# Altium integrated library BYTECH_HW_LIB_2019.IntLib: 907 symbols (part 3 of 6) (continued)
## YJ-18010-nRF52840 (continued)
text: LGA Pads

## 25NA470MEFC10X20
designator C?, comment 470uF/25V
CAP ALUM 470uF 20% 25V RADIAL; MPN: 25NA470MEFC10X20; Solder: WAVE; CompanyID: VT-00047; Value: 470uF/25V; Category: CAPACITOR; PinCount: 2
footprint CAP_ALUM_D100_S50_H200
pins: 1, 2
1 alternate drawing of the same symbol

## 106CKR050M
designator C?, comment 106/50V
CAP ALUM 10uF 50V 20% RADIAL; MPN: 106CKR050M; Solder: WAVE; CompanyID: VT-00054; Value: 106/50V; Category: CAPACITOR; PinCount: 2
footprint CAP_ALUM_D050_S20_H110
pins: 1, 2
1 alternate drawing of the same symbol

## 293D106X9025C2TE3
designator C?, comment 106/25V
CAP TANT 10uF 25V 10% 2312; MPN: 293D106X9025C2TE3;T491C106K025AT7280; CompanyID: VT-00020; Solder: SMT; Value: 106/25V; Category: CAPACITOR; PinCount: 2
footprint CAP_TANTAL_2312(6032) (Chip Resistor, Body 6.0x3.2mm, IPC High Density)
pins: 1, 2

## 0603N330J500CT
designator C?, comment 33p/50V
CAP CER 33pF 50V 5%  0603; MPN: CL10C330JB8NNNC, 0603N330J500CT; CompanyID: VT-01106; Solder: SMT; Value: 33p/50V; Category: CAPACITOR; PinCount: 2
footprint CAPC-0603 (1608) (Resistor, Chip; 1.60 mm L X 0.80 mm W X 0.50 mm H body)
pins: 1, 2

## 0603N331J500CT
designator C?, comment 330p/50V
CAP CER 330PF 50V C0G/NP0 0603; MPN: 0603N331J500CT; MFR: Walsin Technology Corporation; Solder: SMT; Value: 330p/50V; Category: CAPACITOR; PinCount: 2
footprint CAPC-0603 (1608) (Resistor, Chip; 1.60 mm L X 0.80 mm W X 0.50 mm H body)
pins: 1, 2

## 0805C225K8PAC7800
designator C?, comment 225/10V
CAP CER 2.2uF 10% 10V X5R 0805; MPN: 0805C225K8PAC7800; CompanyID: VT-00292; Solder: SMT; Value: 225/10V; Category: CAPACITOR; PinCount: 2
footprint CAPC-0805 (2012) (Resistor, Chip; 2.00 mm L X 1.25 mm W X 0.70 mm H body)
pins: 1, 2

## 1206X107M6R3CT
designator C?, comment 107/6.3V
CAP CER MLCC 100uF 6.3V 20% X7R 1206; MPN: 1206X107M6R3CT; CompanyID: VT-00925; Solder: SMT; Value: 107/6.3V; Category: CAPACITOR; PinCount: 2
footprint CAPC-0402 (1005) (Resistor Chip, Body 1.0x0.5mm, IPC High Density)
pins: 1, 2

## 3314J-1-103E
designator R?, comment 10K
TRIMMER 10KOHM 0.25W J LEAD TOP; MPN: 3314J-1-103E; MFR: Bourns Inc.; Solder: SMT; Value: 10K; Category: RESISTOR
footprint 3314J-1 (Footprint not found)
pins: 1, 2, 3

## 3314J-1-104E
designator R?, comment 100K
TRIMMER 100KOHM 0.25W J LEAD TOP; MPN: 3314J-1-104E; MFR: Bourns Inc.; Solder: SMT; Value: 100K; Category: RESISTOR
footprint 3314J-1 (Footprint not found)
pins: 1, 2, 3

## 08055A391FAT2A
designator C?, comment 391/50V
CAP CER 390PF 50V NP0 0805; MPN: 08055A391FAT2A; CompanyID: VT-01334; Solder: SMT; Value: 391/50V; Category: CAPACITOR; PinCount: 2
footprint CAPC-0805 (2012) (Resistor, Chip; 2.00 mm L X 1.25 mm W X 0.70 mm H body)
pins: 1, 2

## 22201C106MAT2A
designator C?, comment 10uF/100V
CAP CER 10UF 100V X7R 2220; MPN: 22201C106MAT2A; MFR: AVX Corporation; Solder: SMT; Value: 10uF/100V; Category: CAPACITOR; PinCount: 2
footprint CAPC-2220 (5750) (Footprint not found)
pins: 1, 2

## 742792042
designator L?, comment 600OHM/200mA
IND-FERRITE BEAD 600 OHM 1LN 0805; MPN: 742792042; CompanyID: VT-01115; Solder: SMT; Value: 600OHM/200mA; Category: FERRITE BEAD; PinCount: 2
footprint IND-0805 (2012) (Resistor, Chip; 2.00 mm L X 1.25 mm W X 0.70 mm H body)
pins: 1, 2

## 74404084150
designator L?, comment 15uH
FIXED IND 15UH 2.6A 47 MOHM SMD; MPN: 74404084150; MFR: Würth Elektronik; Solder: SMT; Value: 15uH; Category: INDUCTOR; PinCount: 2
footprint IND-8x8mm
pins: 1, 2

## ABLS-20.000MHZ-B2-T
designator Y?, comment 20MHz
CRYSTAL 20.0000MHZ 18PF SMD; MPN: ABLS-20.000MHZ-B2-T; Solder: SMT; CompanyID: VT-xxxx; Value: 20MHz; Category: CRYSTAL
pins: 1 OSC1, 2 OSC2

## ABM3-8.000MHZ-D2Y-T
designator X?, comment 8MHz
CRYSTAL 8.0000MHZ 18pF SMD; MPN: ABM3-8.000MHZ-D2Y-T; Solder: SMT; CompanyID: VT-00517; Value: 8MHz; Category: CRYSTAL
footprint CRYSTAL_ABM3 5x3.2mm (Crystal 5x3.2mm)
pins: 1 OSC1, 2 OSC2
text: 8M

## ABM3-12.000MHZ-D2Y-T
designator X?, comment 12MHz
CRYSTAL 12.0000MHZ 18pF SMD; MPN: ABM3-12.000MHZ-D2Y-T; Solder: SMT; CompanyID: VT-01247; Value: 12MHz; Category: CRYSTAL
footprint CRYSTAL_ABM3 5x3.2mm (Crystal 5x3.2mm)
pins: 1 OSC1, 2 OSC2
text: 12M

## ABM3-50.000MHZ-D2Y-T
designator X?, comment 50MHz
CRYSTAL 50.0000MHZ 18pF SMD; MPN: ABM3-50.000MHZ-D2Y-T; MFR: Abracon LLC; Solder: SMT; Value: 50MHz; Category: CRYSTAL
footprint CRYSTAL_ABM3 5x3.2mm (Crystal 5x3.2mm)
pins: 1 OSC1, 2 OSC2

## ABM8G-24.000MHZ-18-D2Y-T
designator Y?, comment 24MHz
CRYSTAL 24.0000MHZ 18PF SMD; MPN: ABM8G-24.000MHZ-18-D2Y-T; Solder: SMT; CompanyID: VT-xxx; Value: 24MHz; Category: CRYSTAL
footprint CRYSTALL_SMD_3225
pins: 1, 2, 3, 4

## ABM8G-25.000MHZ-18-D2Y-T
designator Y?, comment 25MHz
CRYSTAL 25.0000MHZ 18PF SMD; MPN: ABM8G-25.000MHZ-18-D2Y-T; MFR: Abracon LLC; Solder: SMT; CompanyID: VT-xxx; Value: 25MHz; Category: CRYSTAL
footprint CRYSTALL_SMD_3225
pins: 1, 2, 3, 4

## ABS06-107-32.768kHz-T
designator X?, comment 32.768KHz
CRYSTAL 32.7680KHZ 4pF SMD; MPN: ABS06-107-32.768kHz-T; CompanyID: VT-00666; Solder: SMT; Value: 32.768KHz; Category: CRYSTAL
footprint CRYSTAL_ABS06 2x1.2mm (Crystal 2x1.2mm)
pins: 1 OSC1, 2 OSC2
text: 32K

## ABS07-32.768KHZ-T
designator X?, comment 32.768KHz
CRYSTAL 32.7680KHZ 12.5pF SMD; MPN: ABS07-32.768KHZ-T; Solder: SMT; CompanyID: VT-01153; Value: 32.768KHz; Category: CRYSTAL
footprint Crystal_ABS07_SMD-3.2x1.5MM
pins: 1 OSC1, 2 OSC2
text: 32K

## ABS25-32.768KHZ-6-T
designator Y?, comment 32.768KHz
CRYSTAL 32.7680KHZ 6PF SMD; MPN: ABS25-32.768KHZ-6-T; Solder: SMT; CompanyID: VT-00876; Value: 32.768KHz; Category: CRYSTAL
footprint CRYSTAL_ABS25-32768_4P (CRYSTAL 32.768KHZ 6PF SMD)
pins: 1, 2, 3, 4

## AC0402KRX7R7BB102
designator C?, comment 102/16V
CAP CER 1000PF 16V X7R 0402; MPN: AC0402KRX7R7BB102; MPR: Yageo; Sloder: 0402; Manufacturer: Yageo; Category: Capacitor; Value: 102/16V
footprint CAPC-0402 (1005) (Resistor Chip, Body 1.0x0.5mm, IPC High Density)
pins: 1, 2

## AC0603FR-0713KL
designator R?, comment 13K
RES SMD 13K OHM 1% 1/10W 0603; MPN: AC0603FR-0713KL; CompanyID: VT-00329; Solder: SMT; Value: 13K; Category: RESISTOR
footprint RESC-0603 (1608) (Resistor, Chip; 1.60 mm L X 0.80 mm W X 0.50 mm H body)
pins: 1, 2

## AIMC-0603-47NJ-T
designator L?, comment 47nH/0.3A
IND-FIXED 47nH 300mA 700 mOhm 0603; MPN: AIMC-0603-47NJ-T; CompanyID: VT-01094; Solder: SMT; Value: 47nH/0.3A; Category: INDUCTOR
footprint IND-0603 (1608) (Resistor, Chip; 1.60 mm L X 0.80 mm W X 0.50 mm H body)
pins: 1, 2

## AU-25.000MBE-T
designator Y?, comment OSC25M
XTAL OSC XO 25.0000MHZ CMOS SMD; MPN: AU-25.000MBE-T; Solder: SMT; Value: OSC25M; Category: CRYSTAL; PinCount: 4
footprint CRYSTALL_SMD_3225
pins: 1 EN, 2 GND, 3 OUT, 4 V+

## B41888C6107M000
designator C?, comment 100uF/50V
CAP ALUM 100UF 20% 50V RADIAL; MPN: B41888C6107M000; MFR: EPCOS (TDK); Solder: WAVE; Value: 100uF/50V; Category: CAPACITOR; PinCount: 2
footprint CAP_ALUM_D080_S35_H150
pins: 1, 2
1 alternate drawing of the same symbol

## BUZZ_INDUCTOR
designator L?, comment BUZZ IND
3 PIN INDUCTOR FOR BUZZER BOOST; MPN: 9*12-680UH+145MH; Solder: WAVE; Value: 9*12-680UH+145MH; MFR_URL: https://item.taobao.com/item.htm?spm=a230r.1.14.22.5e027f5bc13Qjp; MFR: *; Category: INDUCTOR
footprint BUZZ_IND
pins: 1, 2, 3

## C0402C100J3GACTU
designator C?, comment 10pF/25V
CAP CER 10PF 25V C0G/NP0 0402; MPN: C0402C100J3GACTU; MFR: KEMET; Solder: 0402; Value: 10pF/25V; Category: Capacitor; Digikey MPN: 399-7746-1-ND
footprint CAPC-0402 (1005) (Resistor Chip, Body 1.0x0.5mm, IPC High Density)
pins: 1, 2

## C0402C150J4GACTU
designator C?, comment 15p/16V
CAP CER 15PF 16V C0G/NP0 0402; MPN: C0402C150J4GACTU; MFR: KEMET; Solder: 0402; Category: Capacitor; Value: 15p/16V
footprint CAPC-0402 (0506) (Resistor Chip, Body 0.5x0.6mm, IPC High Density)
pins: 1, 2

## C0603C102K5RACTU
designator C?, comment 102/50V
CAP CER 1nF 50V 10% X7R 0603; MPN: C0603C102K5RACTU; CompanyID: VT-00573; Solder: SMT; Value: 102/50V; Category: CAPACITOR; PinCount: 2
footprint CAPC-0603 (1608) (Resistor, Chip; 1.60 mm L X 0.80 mm W X 0.50 mm H body)
pins: 1, 2

## C0603C104K5RACTU
designator C?, comment 104/50V
CAP CER 0.1uF 50V 10% X7R 0603; MPN: C0603C104K5RACTU; CompanyID: VT-00982; Solder: SMT; Value: 104/50V; Category: CAPACITOR; PinCount: 2
footprint CAPC-0603 (1608) (Resistor, Chip; 1.60 mm L X 0.80 mm W X 0.50 mm H body)
pins: 1, 2

## C0603C152K5RACTU
designator C?, comment 152/50V
CAP CER 1500PF 50V X7R 0603; MPN: C0603C152K5RACTU; Solder: SMT; Value: 152/50V; Category: CAPACITOR; PinCount: 2
footprint CAPC-0603 (1608) (Resistor, Chip; 1.60 mm L X 0.80 mm W X 0.50 mm H body)
pins: 1, 2

## C0603C333K5RACTU
designator C?, comment 33nF/50V
CAP CER 0.033UF 50V X7R 0603; MPN: C0603C333K5RACTU; Solder: SMT; Value: 33nF/50V; Category: CAPACITOR; PinCount: 2
footprint CAPC-0603 (1608) (Resistor, Chip; 1.60 mm L X 0.80 mm W X 0.50 mm H body)
pins: 1, 2

## C0805C151J5GACTU
designator C?, comment 151/50V
CAP CER 150pF 5% 50V C0G/NP0 0805; MPN: C0805C151J5GACTU; Solder: SMT; CompanyID: VT-00072; Value: 151/50V; Category: CAPACITOR; PinCount: 2
footprint CAPC-0805 (2012) (Resistor, Chip; 2.00 mm L X 1.25 mm W X 0.70 mm H body)
pins: 1, 2

## C0805C330K1HAC7800
designator C?, comment 33p/100V
CAP CER 0805 33PF 100V ULTRA STA; MPN: C0805C330K1HAC7800; MFR: KEMET; Solder: SMT; Value: 33p/100V; Category: CAPACITOR; PinCount: 2
footprint CAPC-0805 (2012) (Resistor, Chip; 2.00 mm L X 1.25 mm W X 0.70 mm H body)
pins: 1, 2

## C0805C331K1HAC7800
designator C?, comment 330p/100V
CAP CER 0805 330PF 100V ULTRA STA; MPN: C0805C331K1HAC7800; MFR: KEMET; Solder: SMT; Value: 330p/100V; Category: CAPACITOR; PinCount: 2
footprint CAPC-0805 (2012) (Resistor, Chip; 2.00 mm L X 1.25 mm W X 0.70 mm H body)
pins: 1, 2

## C0805JRNPO9BN100
designator C?, comment 10p/50V
CAP CER 10pF 5% 50V C0G/NPO 0805; MPN: C0805JRNPO9BN100; CompanyID: VT-00655; Solder: SMT; Value: 10p/50V; Category: CAPACITOR; PinCount: 2
footprint CAPC-0805 (2012) (Resistor, Chip; 2.00 mm L X 1.25 mm W X 0.70 mm H body)
pins: 1, 2

## C4532X7R1H685K250KB
designator C?, comment 685/50V
CAP CER 6.8uF  10% 50V X7R 1812; MPN: C4532X7R1H685K250KB; CompanyID: VT-00051; Solder: SMT; Value: 685/50V; Category: CAPACITOR; PinCount: 2
footprint CAPC-1812 (4532) (Capacitor, Chip; 4.50 mm L X 3.20 mm W X 0.90 mm H body)
pins: 1, 2

## CAPC NF 0603
designator C?, comment NF
CAP SMD, Not Fill, 0603; Solder: Not Fill; Value: NF; Category: CAPACITOR
footprint CAPC-0603 (1608) (Resistor, Chip; 1.60 mm L X 0.80 mm W X 0.50 mm H body)
pins: 1, 2

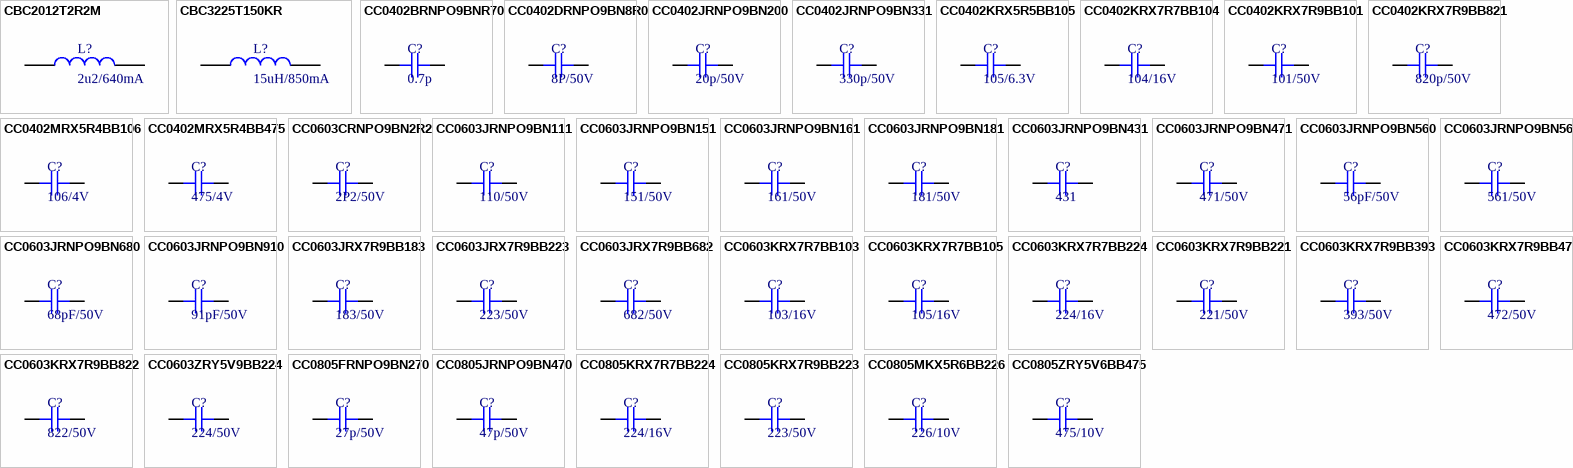
[diagram p18: symbols CBC2012T2R2M to CC0805ZRY5V6BB475]

## CBC2012T2R2M
designator L?, comment 2u2/640mA
IND-FIXED 2.2uH 20% 640mA 429 mOHM 0805; MPN: CBC2012T2R2M; CompanyID: VT-01204; Solder: SMT; Value: 2u2/640mA; Category: CAPACITOR; PinCount: 2
footprint IND-0805 (2012) (Resistor, Chip; 2.00 mm L X 1.25 mm W X 0.70 mm H body)
pins: 1, 2

## CBC3225T150KR
designator L?, comment 15uH/850mA
FIXED IND 15UH 850MA 253.5 MOHM; MPN: CBC3225T150KR; MFR: Taiyo Yuden; Solder: SMT; Value: 15uH/850mA; Category: INDUCTOR
footprint IND-1210 (3225) (Resistor, Chip; 3.10 mm L X 2.60 mm W X 0.90 mm H body)
pins: 1, 2

## CC0402BRNPO9BNR70
designator C?, comment 0.7p
CAP CER 0.7PF 50V NPO 0402; MPN: CC0402BRNPO9BNR70; MFR: Yageo; Solder: 0402; Category: Capacitor; Value: 0.7p
footprint CAPC-0402 (0506) (Resistor Chip, Body 0.5x0.6mm, IPC High Density)
pins: 1, 2

## CC0402DRNPO9BN8R0
designator C?, comment 8P/50V
CAP CER 8PF 50V C0G/NPO 0402; MPN: Yageo; MFR: CC0402DRNPO9BN8R0; Solder: 0402; Category: Capacitor; Value: 8P/50V
footprint CAPC-0402 (1005) (Resistor Chip, Body 1.0x0.5mm, IPC High Density)
pins: 1, 2

## CC0402JRNPO9BN200
designator C?, comment 20p/50V
CAP CER 20PF 50V C0G/NPO 0402; MPN: CC0402JRNPO9BN200; MFR: Yageo; Solder: 0402; Category: Capacitor; Value: 20p/50V
footprint CAPC-0402 (1005) (Resistor Chip, Body 1.0x0.5mm, IPC High Density)
pins: 1, 2

## CC0402JRNPO9BN331
designator C?, comment 330p/50V
CAP CER 330PF 50V C0G/NPO 0402; MPN: CC0402JRNPO9BN331; MPR: Yageo; Sloder: 0402; Manufacturer: Yageo; Category: Capacitor; Value: 330p/50V
footprint CAPC-0402 (1005) (Resistor Chip, Body 1.0x0.5mm, IPC High Density)
pins: 1, 2

## CC0402KRX5R5BB105
designator C?, comment 105/6.3V
CAP CER 1UF 6.3V X5R 0402; MPN: CC0402KRX5R5BB105; MPR: Yageo; Sloder: 0402; Manufactory: Yageo; Category: Capacitor; Value: 105/6.3V
footprint CAPC-0402 (1005) (Resistor Chip, Body 1.0x0.5mm, IPC High Density)
pins: 1, 2

## CC0402KRX7R7BB104
designator C?, comment 104/16V
CAP CER 0.1UF 16V X7R 0402; MPN: CC0402KRX7R7BB104; MPR: Yageo; Sloder: SMD; Category: Capacitor; Value: 104/16V
footprint CAPC-0402 (1005) (Resistor Chip, Body 1.0x0.5mm, IPC High Density)
pins: 1, 2

## CC0402KRX7R9BB101
designator C?, comment 101/50V
CAP CER 100PF 50V X7R 0402; MPN: CC0402KRX7R9BB101; MPR: Yageo; Sloder: 0402; Manufacturer: Yageo; Category: 0402; Value: 101/50V
footprint CAPC-0402 (1005) (Resistor Chip, Body 1.0x0.5mm, IPC High Density)
pins: 1, 2

## CC0402KRX7R9BB821
designator C?, comment 820p/50V
CAP CER 820PF 50V X7R 0402; MPN: CC0402KRX7R9BB821; MPR: Yageo; Sloder: 0402; Manufacturer: Yageo; Category: Capacitor; Value: 820p/50V
pins: 1, 2

## CC0402MRX5R4BB106
designator C?, comment 106/4V
CAP CER 10UF 4V X5R 0402; MPN: CC0402MRX5R4BB106; Manufacturer: Yageo; Sloder: 0402; Category: Capacitor; Value: 106/4V
footprint CAPC-0402 (1005) (Resistor Chip, Body 1.0x0.5mm, IPC High Density)
pins: 1, 2

## CC0402MRX5R4BB475
designator C?, comment 475/4V
CAP CER 4.7UF 4V X5R 0402; MPN: CC0402MRX5R4BB475; MPR: Yageo; Sloder: 0402; Manufacturer: Yageo; Category: Capacitor; Value: 475/4V
footprint CAPC-0402 (1005) (Resistor Chip, Body 1.0x0.5mm, IPC High Density)
pins: 1, 2

## CC0603CRNPO9BN2R2
designator C?, comment 2P2/50V
CAP CER 2.2pF 50V +- 0.25pF COG/NPO 0603; MPN: CC0603CRNPO9BN2R2; Solder: SMT; CompanyID: VT-xxxxx; Value: 2P2/50V; Category: CAPACITOR; PinCount: 2
footprint CAPC-0603 (1608) (Resistor, Chip; 1.60 mm L X 0.80 mm W X 0.50 mm H body)
pins: 1, 2

## CC0603JRNPO9BN111
designator C?, comment 110/50V
CAP CER 110PF 50V 5% COG/NPO 0603; MPN: CC0603JRNPO9BN111; Solder: SMT; CompanyID: VT-01340; Value: 110/50V; Category: CAPACITOR; PinCount: 2
footprint CAPC-0603 (1608) (Resistor, Chip; 1.60 mm L X 0.80 mm W X 0.50 mm H body)
pins: 1, 2

## CC0603JRNPO9BN151
designator C?, comment 151/50V
CAP CER 150PF 50V 5% COG/NPO 0603; MPN: CC0603JRNPO9BN151; Solder: SMT; CompanyID: VT-01339; Value: 151/50V; Category: CAPACITOR; PinCount: 2
footprint CAPC-0603 (1608) (Resistor, Chip; 1.60 mm L X 0.80 mm W X 0.50 mm H body)
pins: 1, 2

## CC0603JRNPO9BN161
designator C?, comment 161/50V
CAP CER 160PF 50V NPO 0603; MPN: CC0603JRNPO9BN161; Solder: SMT; CompanyID: VT-01338; Value: 161/50V; Category: CAPACITOR; PinCount: 2
footprint CAPC-0603 (1608) (Resistor, Chip; 1.60 mm L X 0.80 mm W X 0.50 mm H body)
pins: 1, 2

## CC0603JRNPO9BN181
designator C?, comment 181/50V
CAP CER 180PF 50V 5% COG/NPO 0603; MPN: CC0603JRNPO9BN181; Solder: SMT; CompanyID: VT-01337; Value: 181/50V; Category: CAPACITOR; PinCount: 2
footprint CAPC-0603 (1608) (Resistor, Chip; 1.60 mm L X 0.80 mm W X 0.50 mm H body)
pins: 1, 2

## CC0603JRNPO9BN431
designator C?, comment 431
CAP CER 430PF 50V 5% COG/NPO 0603; MPN: CC0603JRNPO9BN431; Solder: SMT; CompanyID: VT-01333; Value: 431; Category: CAPACITOR; PinCount: 2
footprint CAPC-0603 (1608) (Resistor, Chip; 1.60 mm L X 0.80 mm W X 0.50 mm H body)
pins: 1, 2

## CC0603JRNPO9BN471
designator C?, comment 471/50V
CAP CER 470pF 50V 5% C0G/NPO 0603; MPN: CC0603JRNPO9BN471; Solder: SMT; CompanyID: VT-01332; Value: 471/50V; Category: CAPACITOR; PinCount: 2
footprint CAPC-0603 (1608) (Resistor, Chip; 1.60 mm L X 0.80 mm W X 0.50 mm H body)
pins: 1, 2

## CC0603JRNPO9BN560
designator C?, comment 56pF/50V
CAP CER 56PF 50V 5% COG/NPO 0603; MPN: CC0603JRNPO9BN560; Solder: SMT; CompanyID: VT-00150; Value: 56pF/50V; Category: CAPACITOR; PinCount: 2
footprint CAPC-0603 (1608) (Resistor, Chip; 1.60 mm L X 0.80 mm W X 0.50 mm H body)
pins: 1, 2

## CC0603JRNPO9BN561
designator C?, comment 561/50V
CAP CER 560PF 50V 5% COG/NPO 0603; MPN: CC0603JRNPO9BN561; Solder: SMT; CompanyID: VT-01331; Value: 561/50V; Category: CAPACITOR; PinCount: 2
footprint CAPC-0603 (1608) (Resistor, Chip; 1.60 mm L X 0.80 mm W X 0.50 mm H body)
pins: 1, 2

## CC0603JRNPO9BN680
designator C?, comment 68pF/50V
CAP CER 68PF 50V 5% COG/NPO 0603; MPN: CC0603JRNPO9BN680; Solder: SMT; CompanyID: VT-01342; Value: 68pF/50V; Category: CAPACITOR; PinCount: 2
footprint CAPC-0603 (1608) (Resistor, Chip; 1.60 mm L X 0.80 mm W X 0.50 mm H body)
pins: 1, 2

## CC0603JRNPO9BN910
designator C?, comment 91pF/50V
CAP CER 91PF 50V 5% COG/NPO 0603; MPN: CC0603JRNPO9BN910; Solder: SMT; CompanyID: VT-01341; Value: 91pF/50V; Category: CAPACITOR; PinCount: 2
footprint CAPC-0603 (1608) (Resistor, Chip; 1.60 mm L X 0.80 mm W X 0.50 mm H body)
pins: 1, 2

## CC0603JRX7R9BB183
designator C?, comment 183/50V
CAP CER 0.018UF 50V X7R 0603; MPN: CC0603JRX7R9BB183; MFR: Yageo; Solder: SMT; Value: 183/50V; Category: CAPACITOR; PinCount: 2
footprint CAPC-0603 (1608) (Resistor, Chip; 1.60 mm L X 0.80 mm W X 0.50 mm H body)
pins: 1, 2

## CC0603JRX7R9BB223
designator C?, comment 223/50V
CAP CER 0.022uF 5% 50V X7R 0603; MPN: CC0603JRX7R9BB223; Solder: SMT; CompanyID: VT-00673; Value: 223/50V; Category: CAPACITOR; PinCount: 2
footprint CAPC-0603 (1608) (Resistor, Chip; 1.60 mm L X 0.80 mm W X 0.50 mm H body)
pins: 1, 2

## CC0603JRX7R9BB682
designator C?, comment 682/50V
CAP CER 6.8nF 5% 50V X7R 0603; MPN: CC0603JRX7R9BB682; CompanyID: VT-00669; Solder: SMT; Value: 682/50V; Category: CAPACITOR; PinCount: 2
footprint CAPC-0603 (1608) (Resistor, Chip; 1.60 mm L X 0.80 mm W X 0.50 mm H body)
pins: 1, 2

## CC0603KRX7R7BB103
designator C?, comment 103/16V
CAP CER 10nF 16V 10% X7R 0603; MPN: CC0603KRX7R7BB103; CompanyID: VT-00592; Solder: SMT; Value: 103/16V; Category: CAPACITOR; PinCount: 2
footprint CAPC-0603 (1608) (Resistor, Chip; 1.60 mm L X 0.80 mm W X 0.50 mm H body)
pins: 1, 2

## CC0603KRX7R7BB105
designator C?, comment 105/16V
CAP CER 1uF 10% 16V X7R 0603; MPN: CC0603KRX7R7BB105; CompanyID: VT-00017; Solder: SMT; Value: 105/16V; Category: CAPACITOR; PinCount: 2
footprint CAPC-0603 (1608) (Resistor, Chip; 1.60 mm L X 0.80 mm W X 0.50 mm H body)
pins: 1, 2

## CC0603KRX7R7BB224
designator C?, comment 224/16V
CAP CER 0.22UF 16V X7R 0603; MPN: CC0603KRX7R7BB224; MFR: Yageo; Solder: SMT; Value: 224/16V; Category: CAPACITOR; PinCount: 2
footprint CAPC-0603 (1608) (Resistor, Chip; 1.60 mm L X 0.80 mm W X 0.50 mm H body)
pins: 1, 2

## CC0603KRX7R9BB221
designator C?, comment 221/50V
CAP CER 220PF 50V 5% COG/NPO 0603; MPN: CC0603KRX7R9BB221; Solder: SMT; CompanyID: VT-01336; Value: 221/50V; Category: CAPACITOR; PinCount: 2
footprint CAPC-0603 (1608) (Resistor, Chip; 1.60 mm L X 0.80 mm W X 0.50 mm H body)
pins: 1, 2

## CC0603KRX7R9BB393
designator C?, comment 393/50V
CAP CER 0.039UF 50V X7R 0603; MPN: CC0603KRX7R9BB393; MFR: Yageo; Solder: SMT; Value: 393/50V; Category: CAPACITOR; PinCount: 2
footprint CAPC-0603 (1608) (Resistor, Chip; 1.60 mm L X 0.80 mm W X 0.50 mm H body)
pins: 1, 2

## CC0603KRX7R9BB473
designator C?, comment 472/50V
CAP CER 47nF 50V 10% X7R 0603; MPN: CC0603KRX7R9BB473; CompanyID: VT-00664; Solder: SMT; Value: 472/50V; Category: CAPACITOR; PinCount: 2
footprint CAPC-0603 (1608) (Resistor, Chip; 1.60 mm L X 0.80 mm W X 0.50 mm H body)
pins: 1, 2

## CC0603KRX7R9BB822
designator C?, comment 822/50V
CAP CER 8200PF 50V X7R 0603; MPN: CC0603KRX7R9BB822; MFR: Yageo; Solder: SMT; Value: 822/50V; Category: CAPACITOR; PinCount: 2
footprint CAPC-0603 (1608) (Resistor, Chip; 1.60 mm L X 0.80 mm W X 0.50 mm H body)
pins: 1, 2

## CC0603ZRY5V9BB224
designator C?, comment 224/50V
CAP CER 0.22UF 50V Y5V 0603; MPN: CC0603ZRY5V9BB224; Solder: SMT; Value: 224/50V; Category: CAPACITOR; PinCount: 2
footprint CAPC-0603 (1608) (Resistor, Chip; 1.60 mm L X 0.80 mm W X 0.50 mm H body)
pins: 1, 2

## CC0805FRNPO9BN270
designator C?, comment 27p/50V
CAP CER 27pF 1% 50V NPO 0805; MPN: CC0805FRNPO9BN270; CompanyID: VT-00633; Solder: SMT; Value: 27p/50V; Category: CAPACITOR; PinCount: 2
footprint CAPC-0805 (2012) (Resistor, Chip; 2.00 mm L X 1.25 mm W X 0.70 mm H body)
pins: 1, 2

## CC0805JRNPO9BN470
designator C?, comment 47p/50V
CAP CER 47pF 5% 50V C0G/NPO 0805; MPN: CC0805JRNPO9BN470; CompanyID: VT-01179; Solder: SMT; Value: 47p/50V; Category: CAPACITOR; PinCount: 2
footprint CAPC-0805 (2012) (Resistor, Chip; 2.00 mm L X 1.25 mm W X 0.70 mm H body)
pins: 1, 2

## CC0805KRX7R7BB224
designator C?, comment 224/16V
CAP CER 0.22uF 10% 16V X7R 0805; MPN: CC0805KRX7R7BB224; CompanyID: VT-00016; Solder: SMT; Value: 224/16V; Category: CAPACITOR; PinCount: 2
footprint CAPC-0805 (2012) (Resistor, Chip; 2.00 mm L X 1.25 mm W X 0.70 mm H body)
pins: 1, 2

## CC0805KRX7R9BB223
designator C?, comment 223/50V
CAP CER 22nF 10% 50V X7R 0805; MPN: CC0805KRX7R9BB223; CompanyID: VT-00656; Solder: SMT; Value: 223/50V; Category: CAPACITOR; PinCount: 2
footprint CAPC-0805 (2012) (Resistor, Chip; 2.00 mm L X 1.25 mm W X 0.70 mm H body)
pins: 1, 2

## CC0805MKX5R6BB226
designator C?, comment 226/10V
CAP CER 22uF 20% 10V X5R 0805; MPN: CC0805MKX5R6BB226; Solder: SMT; CompanyID: VT-01177; Value: 226/10V; Category: CAPACITOR; PinCount: 2
footprint CAPC-0805 (2012) (Resistor, Chip; 2.00 mm L X 1.25 mm W X 0.70 mm H body)
pins: 1, 2

## CC0805ZRY5V6BB475
designator C?, comment 475/10V
CAP CER 4.7uF -20% +80% 10V Y5V 0805; MPN: CC0805ZRY5V6BB475; Solder: SMT; CompanyID: VT-01178; Value: 475/10V; Category: CAPACITOR; PinCount: 2
footprint CAPC-0805 (2012) (Resistor, Chip; 2.00 mm L X 1.25 mm W X 0.70 mm H body)
pins: 1, 2

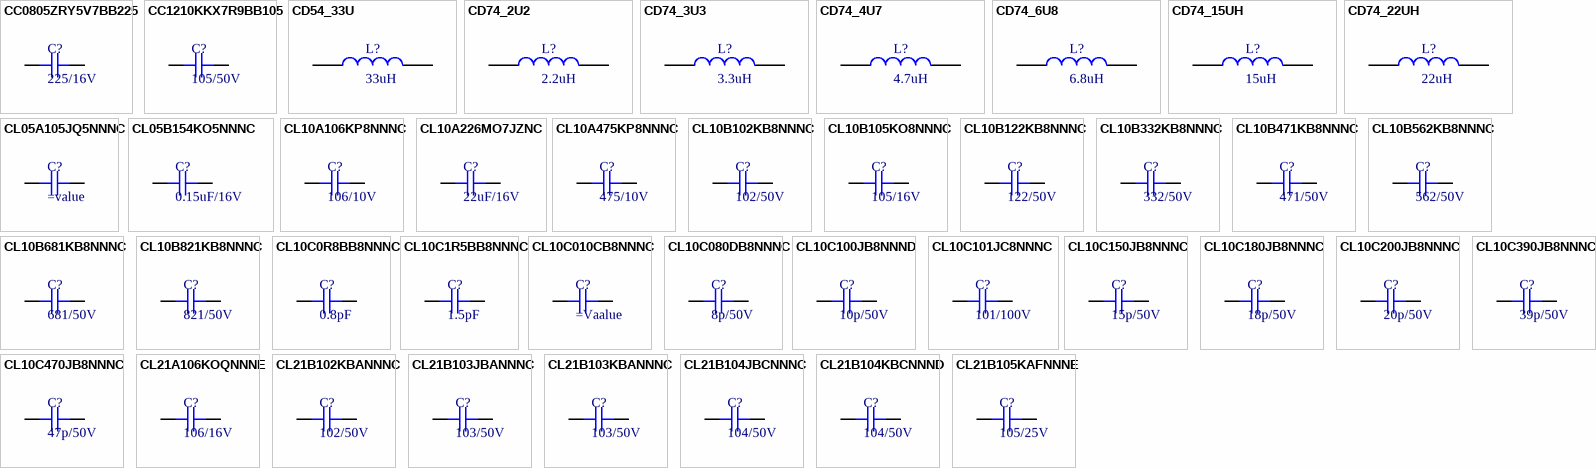
[diagram p19: symbols CC0805ZRY5V7BB225 to CL21B105KAFNNNE]

## CC0805ZRY5V7BB225
designator C?, comment 225/16V
CAP CER 2.2uF -20%, +80% 16V Y5V 0805; MPN: CC0805ZRY5V7BB225; CompanyID: VT-01180; Solder: SMT; Value: 225/16V; Category: CAPACITOR; PinCount: 2
footprint CAPC-0805 (2012) (Resistor, Chip; 2.00 mm L X 1.25 mm W X 0.70 mm H body)
pins: 1, 2

## CC1210KKX7R9BB105
designator C?, comment 105/50V
CAP CER 1UF 50V X7R 1210; MPN: CC1210KKX7R9BB105; MFR: Yageo; Solder: SMT; Value: 105/50V; Category: CAPACITOR; PinCount: 2
footprint CAPC-1210 (3225) (Resistor, Chip; 3.10 mm L X 2.60 mm W X 0.90 mm H body)
pins: 1, 2

## CD54_33U
designator L?, comment 33uH
IND-FIXED 33uH CD54; MPN: CD54_33U; Solder: SMT; Value: 33uH; Category: INDUCTOR; PinCount: 2
footprint IND-CD54
pins: 1, 2

## CD74_2U2
designator L?, comment 2.2uH
IND-FIXED 2.2uH CD74 7.4 x 7.4 x 4 MM; MPN: CD74_2U2; Solder: SMT; Value: 2.2uH; Category: INDUCTOR; PinCount: 2
footprint IND-CD74-7x7x4MM
pins: 1, 2

## CD74_3U3
designator L?, comment 3.3uH
IND-FIXED 3.3uH CD74 7.4 x 7.4 x 4 MM; MPN: CD74_3U3; Solder: SMT; Value: 3.3uH; Category: INDUCTOR; PinCount: 2
footprint IND-CD74-7x7x4MM
pins: 1, 2

## CD74_4U7
designator L?, comment 4.7uH
IND-FIXED 4.7uH CD74 7.4 x 7.4 x 4 MM; MPN: CD74_4U7; Solder: SMT; Value: 4.7uH; Category: INDUCTOR; PinCount: 2
footprint IND-CD74-7x7x4MM
pins: 1, 2

## CD74_6U8
designator L?, comment 6.8uH
IND-FIXED 6.8uH CD74 7.4 x 7.4 x 4 MM; MPN: CD74_6U8; Solder: SMT; Value: 6.8uH; Category: INDUCTOR; PinCount: 2
footprint IND-CD74-7x7x4MM
pins: 1, 2

## CD74_15UH
designator L?, comment 15uH
IND-FIXED 15uH CD74 7.4 x 7.4 x 4 MM; MPN: CD74_15UH; Solder: SMT; Value: 15uH; Category: INDUCTOR; PinCount: 2
footprint IND-CD74-7x7x4MM
pins: 1, 2

## CD74_22UH
designator L?, comment 22uH
IND-FIXED 22uH CD74 7.4 x 7.4 x 4 MM; MPN: CD74_22UH; Solder: SMT; Value: 22uH; Category: INDUCTOR; PinCount: 2
footprint IND-CD74-7x7x4MM
pins: 1, 2

## CL05A105JQ5NNNC
designator C?
CAP CER 1UF 6.3V X5R 0402; MPN: CL05A105JQ5NNNC; MFR: Samsung Electro-Mechanics; Solder: 0402; Category: Capacitor; Digikey MPN: 1276-1444-1-ND
footprint CAPC-0402 (1005) (Resistor Chip, Body 1.0x0.5mm, IPC High Density)
pins: 1, 2

## CL05B154KO5NNNC
designator C?, comment 0.15uF/16V
CAP CER 0.15UF 16V X7R 0402; CompanyID: VT-00984; Solder: SMT; MPN: CAP CER 0.15UF 16V X7R 0402; Value: 0.15uF/16V; Category: CAPACITOR; PinCount: 2
footprint CAPC-0402 (1005) (Resistor Chip, Body 1.0x0.5mm, IPC High Density)
pins: 1, 2

## CL10A106KP8NNNC
designator C?, comment 106/10V
CAP CER 10uF 10% 10V X5R 0603; MPN: CL10A106KP8NNNC; CompanyID: VT-00984; Solder: SMT; Value: 106/10V; Category: CAPACITOR; PinCount: 2
footprint CAPC-0603 (1608) (Resistor, Chip; 1.60 mm L X 0.80 mm W X 0.50 mm H body)
pins: 1, 2

## CL10A226MO7JZNC
designator C?, comment 22uF/16V
CAP CER 22UF 16V X5R 0603; MPN: CL10A226MO7JZNC; Solder: SMT; Value: 22uF/16V; Category: CAPACITOR; PinCount: 2
footprint CAPC-0603 (1608) (Resistor, Chip; 1.60 mm L X 0.80 mm W X 0.50 mm H body)
pins: 1, 2

## CL10A475KP8NNNC
designator C?, comment 475/10V
CAP CER 4.7uF 10% 10V X5R 0603; MPN: CL10A475KP8NNNC; CompanyID: VT-00516; Solder: SMT; Value: 475/10V; Category: CAPACITOR; PinCount: 2
footprint CAPC-0603 (1608) (Resistor, Chip; 1.60 mm L X 0.80 mm W X 0.50 mm H body)
pins: 1, 2

## CL10B102KB8NNNC
designator C?, comment 102/50V
CAP CER 1000pF 10% 50V X7R 0603; MPN: CL10B102KB8NNNC; Solder: SMT; CompanyID: VT-00679; Value: 102/50V; Category: CAPACITOR; PinCount: 2
footprint CAPC-0603 (1608) (Resistor, Chip; 1.60 mm L X 0.80 mm W X 0.50 mm H body)
pins: 1, 2

## CL10B105KO8NNNC
designator C?, comment 105/16V
CAP CER 1uF 10% 16V X7R 0603; MPN: CL10B105KO8NNNC; CompanyID: VT-00192; Solder: SMT; Value: 105/16V; Category: CAPACITOR; PinCount: 2
footprint CAPC-0603 (1608) (Resistor, Chip; 1.60 mm L X 0.80 mm W X 0.50 mm H body)
pins: 1, 2

## CL10B122KB8NNNC
designator C?, comment 122/50V
CAP CER 1200pF 10% 50V X7R 0603; MPN: CL10B122KB8NNNC; CompanyID: VT-00198; Solder: SMT; Value: 122/50V; Category: CAPACITOR; PinCount: 2
footprint CAPC-0603 (1608) (Resistor, Chip; 1.60 mm L X 0.80 mm W X 0.50 mm H body)
pins: 1, 2

## CL10B332KB8NNNC
designator C?, comment 332/50V
CAP CER 3300pF 10% 50V X7R 0603; MPN: CL10B332KB8NNNC; MFR: Samsung Electro-Mechanics; CompanyID: VT-01021; Solder: SMT; Value: 332/50V; Category: CAPACITOR; PinCount: 2
footprint CAPC-0603 (1608) (Resistor, Chip; 1.60 mm L X 0.80 mm W X 0.50 mm H body)
pins: 1, 2

## CL10B471KB8NNNC
designator C?, comment 471/50V
CAP CER 470pF 10% 50V X7R 0603; MPN: CL10B471KB8NNNC; CompanyID: VT-00163; Solder: SMT; Value: 471/50V; Category: CAPACITOR; PinCount: 2
footprint CAPC-0603 (1608) (Resistor, Chip; 1.60 mm L X 0.80 mm W X 0.50 mm H body)
pins: 1, 2

## CL10B562KB8NNNC
designator C?, comment 562/50V
CAP CER 5600pF 10% 50V X7R 0603; MPN: CL10B562KB8NNNC; MFR: Samsung Electro-Mechanics; Solder: SMT; Value: 562/50V; Category: CAPACITOR; PinCount: 2
footprint CAPC-0603 (1608) (Resistor, Chip; 1.60 mm L X 0.80 mm W X 0.50 mm H body)
pins: 1, 2

## CL10B681KB8NNNC
designator C?, comment 681/50V
CAP CER 680pF 10% 50V X7R 0603; MPN: CL10B681KB8NNNC; CompanyID: VT-00183; Solder: SMT; Value: 681/50V; Category: CAPACITOR; PinCount: 2
footprint CAPC-0603 (1608) (Resistor, Chip; 1.60 mm L X 0.80 mm W X 0.50 mm H body)
pins: 1, 2

## CL10B821KB8NNNC
designator C?, comment 821/50V
CAP CER 820pF 10% 50V X7R 0603; MPN: CL10B821KB8NNNC; Solder: SMT; Value: 821/50V; Category: CAPACITOR; PinCount: 2
footprint CAPC-0603 (1608) (Resistor, Chip; 1.60 mm L X 0.80 mm W X 0.50 mm H body)
pins: 1, 2

## CL10C0R8BB8NNNC
designator C?, comment 0.8pF
CAP CER 0.8PF 50V C0G/NP0 0603; MPN: CL10C0R8BB8NNNC; Solder: SMT; Value: 0.8pF; Category: CAPACITOR; PinCount: 2
footprint CAPC-0603 (1608) (Resistor, Chip; 1.60 mm L X 0.80 mm W X 0.50 mm H body)
pins: 1, 2

## CL10C1R5BB8NNNC
designator C?, comment 1.5pF
CAP CER 1.5PF 50V C0G/NP0 0603; MPN: CL10C1R5BB8NNNC; Solder: SMT; Value: 1.5pF; Category: CAPACITOR; PinCount: 2
footprint CAPC-0603 (1608) (Resistor, Chip; 1.60 mm L X 0.80 mm W X 0.50 mm H body)
pins: 1, 2

## CL10C010CB8NNNC
designator C?
CAP CER 1pF +-0.25pF  50V C0G/NP0 0603; MPN: CL10C010CB8NNNC; Solder: SMT; CompanyID: VT-01161; Category: CAPACITOR; PinCount: 2
footprint CAPC-0603 (1608) (Resistor, Chip; 1.60 mm L X 0.80 mm W X 0.50 mm H body)
pins: 1, 2

## CL10C080DB8NNNC
designator C?, comment 8p/50V
CAP CER 8pF +- 0.5pF 50V C0G/NP0 0603; MPN: CL10C080DB8NNNC; CompanyID: VT-01173; Solder: SMT; Value: 8p/50V; Category: CAPACITOR; PinCount: 2
footprint CAPC-0603 (1608) (Resistor, Chip; 1.60 mm L X 0.80 mm W X 0.50 mm H body)
pins: 1, 2

## CL10C100JB8NNND
designator C?, comment 10p/50V
CAP CER 10pF 5% 50V NP0 0603; MPN: CL10C100JB8NNND; CompanyID: VT-00983; Solder: SMT; Value: 10p/50V; Category: CAPACITOR; PinCount: 2
footprint CAPC-0603 (1608) (Resistor, Chip; 1.60 mm L X 0.80 mm W X 0.50 mm H body)
pins: 1, 2

## CL10C101JC8NNNC
designator C?, comment 101/100V
CAP CER 100PF 100V C0G/NP0 0603; MPN: CL10C101JC8NNNC; Solder: SMT; Value: 101/100V; Category: CAPACITOR; PinCount: 2
footprint CAPC-0603 (1608) (Resistor, Chip; 1.60 mm L X 0.80 mm W X 0.50 mm H body)
pins: 1, 2

## CL10C150JB8NNNC
designator C?, comment 15p/50V
CAP CER 15pF 5% 50V C0G/NP0 0603; MPN: CL10C150JB8NNNC; CompanyID: VT-01020; Solder: SMT; Value: 15p/50V; Category: CAPACITOR; PinCount: 2
footprint CAPC-0603 (1608) (Resistor, Chip; 1.60 mm L X 0.80 mm W X 0.50 mm H body)
pins: 1, 2

## CL10C180JB8NNNC
designator C?, comment 18p/50V
CAP CER 18pF 5% 50V C0G/NP0 0603; MPN: CL10C180JB8NNNC; CompanyID: VT-00985; Solder: SMT; Value: 18p/50V; Category: CAPACITOR; PinCount: 2
footprint CAPC-0603 (1608) (Resistor, Chip; 1.60 mm L X 0.80 mm W X 0.50 mm H body)
pins: 1, 2

## CL10C200JB8NNNC
designator C?, comment 20p/50V
CAP CER 20pF 5% 50V C0G/NP0 0603; MPN: CL10C200JB8NNNC; CompanyID: VT-00515; Solder: SMT; Value: 20p/50V; Category: CAPACITOR; PinCount: 2
footprint CAPC-0603 (1608) (Resistor, Chip; 1.60 mm L X 0.80 mm W X 0.50 mm H body)
pins: 1, 2

## CL10C390JB8NNNC
designator C?, comment 39p/50V
CAP CER 39pF 5% 50V C0G/NP0 0603; MPN: CL10C390JB8NNNC; Solder: SMT; CompanyID: VT-00845; Value: 39p/50V; Category: CAPACITOR; PinCount: 2
footprint CAPC-0603 (1608) (Resistor, Chip; 1.60 mm L X 0.80 mm W X 0.50 mm H body)
pins: 1, 2

## CL10C470JB8NNNC
designator C?, comment 47p/50V
CAP CER 47pF 5% 50V C0G/NP0 0603; MPN: CL10C470JB8NNNC; CompanyID: VT-00145; Solder: SMT; Value: 47p/50V; Category: CAPACITOR; PinCount: 2
footprint CAPC-0603 (1608) (Resistor, Chip; 1.60 mm L X 0.80 mm W X 0.50 mm H body)
pins: 1, 2

## CL21A106KOQNNNE
designator C?, comment 106/16V
CAP CER 10uF 10%  16V X5R 0805; MPN: CL21A106KOQNNNE; CompanyID: VT-00018; Solder: SMT; Value: 106/16V; Category: CAPACITOR; PinCount: 2
footprint CAPC-0805 (2012) (Resistor, Chip; 2.00 mm L X 1.25 mm W X 0.70 mm H body)
pins: 1, 2

## CL21B102KBANNNC
designator C?, comment 102/50V
CAP CER 1000pF 10% 50V X7R 0805; MPN: CL21B102KBANNNC; CompanyID: VT-00619; Solder: SMT; Value: 102/50V; Category: CAPACITOR; PinCount: 2
footprint CAPC-0805 (2012) (Resistor, Chip; 2.00 mm L X 1.25 mm W X 0.70 mm H body)
pins: 1, 2

## CL21B103JBANNNC
designator C?, comment 103/50V
CAP CER 10000pF 5% 50V X7R 0805; MPN: CL21B103JBANNNC; CompanyID: VT-00678; Solder: SMT; Value: 103/50V; Category: CAPACITOR; PinCount: 2
footprint CAPC-0805 (2012) (Resistor, Chip; 2.00 mm L X 1.25 mm W X 0.70 mm H body)
pins: 1, 2

## CL21B103KBANNNC
designator C?, comment 103/50V
CAP CER 10nF 10% 50V X7R 0805; MPN: CL21B103KBANNNC; Solder: SMT; CompanyID: VT-00014; Value: 103/50V; Category: CAPACITOR; PinCount: 2
footprint CAPC-0805 (2012) (Resistor, Chip; 2.00 mm L X 1.25 mm W X 0.70 mm H body)
pins: 1, 2

## CL21B104JBCNNNC
designator C?, comment 104/50V
CAP CER 0.1uF 5% 50V X7R 0805; MPN: CL21B104JBCNNNC; Solder: SMT; CompanyID: VT-00725; Value: 104/50V; Category: CAPACITOR; PinCount: 2
footprint CAPC-0805 (2012) (Resistor, Chip; 2.00 mm L X 1.25 mm W X 0.70 mm H body)
pins: 1, 2

## CL21B104KBCNNND
designator C?, comment 104/50V
CAP CER 0.1uF 10% 50V X7R 0805; MPN: CL21B104KBCNNND; CompanyID: VT-00013; Solder: SMT; Value: 104/50V; Category: CAPACITOR; PinCount: 2
footprint CAPC-0805 (2012) (Resistor, Chip; 2.00 mm L X 1.25 mm W X 0.70 mm H body)
pins: 1, 2

## CL21B105KAFNNNE
designator C?, comment 105/25V
CAP CER 1uF  10% 25V X7R 0805; MPN: CL21B105KAFNNNE; CompanyID: VT-00012; Solder: SMT; Value: 105/25V; Category: CAPACITOR; PinCount: 2
footprint CAPC-0805 (2012) (Resistor, Chip; 2.00 mm L X 1.25 mm W X 0.70 mm H body)
pins: 1, 2

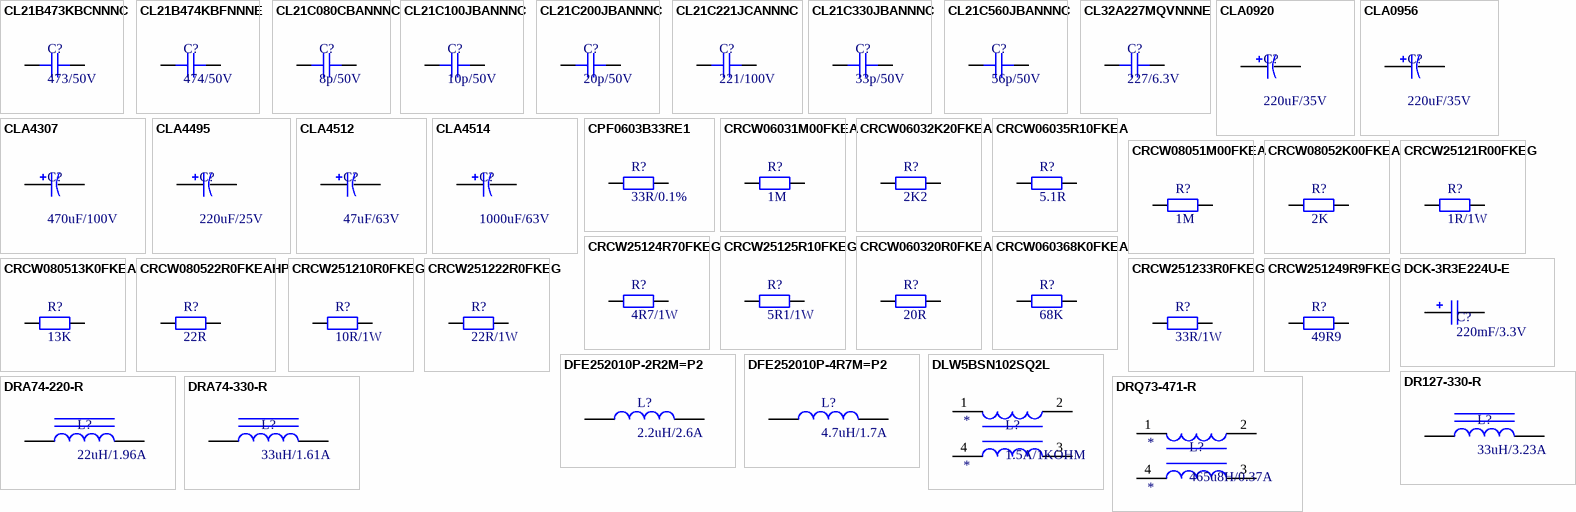
[diagram p20: symbols CL21B473KBCNNNC to DRQ73-471-R]

## CL21B473KBCNNNC
designator C?, comment 473/50V
CAP CER 0.047uF 10% 50V X7R 0805; MPN: CL21B473KBCNNNC; CompanyID: VT-00657; Solder: SMT; Value: 473/50V; Category: CAPACITOR; PinCount: 2
footprint CAPC-0805 (2012) (Resistor, Chip; 2.00 mm L X 1.25 mm W X 0.70 mm H body)
pins: 1, 2

## CL21B474KBFNNNE
designator C?, comment 474/50V
CAP CER 0.47uF 10% 50V X7R 0805; MPN: CL21B474KBFNNNE; Solder: SMT; CompanyID: VT-00930; Value: 474/50V; Category: CAPACITOR; PinCount: 2
footprint CAPC-0805 (2012) (Resistor, Chip; 2.00 mm L X 1.25 mm W X 0.70 mm H body)
pins: 1, 2

## CL21C080CBANNNC
designator C?, comment 8p/50V
CAP CER 8pF +_ 0.25pF 50V C0G/NP0 0805; MPN: CL21C080CBANNNC; CompanyID: VT-00877; Solder: SMT; Value: 8p/50V; Category: CAPACITOR; PinCount: 2
footprint CAPC-0805 (2012) (Resistor, Chip; 2.00 mm L X 1.25 mm W X 0.70 mm H body)
pins: 1, 2

## CL21C100JBANNNC
designator C?, comment 10p/50V
CAP CER 10pF 5% 50V C0G/NP0 0805; MPN: CL21C100JBANNNC; CompanyID: VT-00090; Solder: SMT; Value: 10p/50V; Category: CAPACITOR; PinCount: 2
footprint CAPC-0805 (2012) (Resistor, Chip; 2.00 mm L X 1.25 mm W X 0.70 mm H body)
pins: 1, 2

## CL21C200JBANNNC
designator C?, comment 20p/50V
CAP CER 20pF 5% 50V C0G/NP0 0805; MPN: CL21C200JBANNNC; CompanyID: VT-00314; Solder: SMT; Value: 20p/50V; Category: CAPACITOR; PinCount: 2
footprint CAPC-0805 (2012) (Resistor, Chip; 2.00 mm L X 1.25 mm W X 0.70 mm H body)
pins: 1, 2

## CL21C221JCANNNC
designator C?, comment 221/100V
CAP CER 220pF 5% 100V C0G/NP0 0805; MPN: CL21C221JCANNNC; Solder: SMT; CompanyID: VT-00071; Value: 221/100V; Category: CAPACITOR; PinCount: 2
footprint CAPC-0805 (2012) (Resistor, Chip; 2.00 mm L X 1.25 mm W X 0.70 mm H body)
pins: 1, 2

## CL21C330JBANNNC
designator C?, comment 33p/50V
CAP CER 33pF 5% 50V C0G/NP0 0805; MPN: CL21C330JBANNNC; Solder: SMT; CompanyID: VT-00015; Value: 33p/50V; Category: CAPACITOR; PinCount: 2
footprint CAPC-0805 (2012) (Resistor, Chip; 2.00 mm L X 1.25 mm W X 0.70 mm H body)
pins: 1, 2

## CL21C560JBANNNC
designator C?, comment 56p/50V
CAP CER 56pF 5% 50V C0G/NP0 0805; MPN: CL21C560JBANNNC; Solder: SMT; CompanyID: VT-00068; Value: 56p/50V; Category: CAPACITOR; PinCount: 2
footprint CAPC-0805 (2012) (Resistor, Chip; 2.00 mm L X 1.25 mm W X 0.70 mm H body)
pins: 1, 2

## CL32A227MQVNNNE
designator C?, comment 227/6.3V
CAP CER 220uF 20% 6.3V X5R 1210; MPN: CL32A227MQVNNNE; CompanyID: VT-01105; Solder: SMT; Value: 227/6.3V; Category: CAPACITOR; PinCount: 2
footprint CAPC-1210 (3225) (Resistor, Chip; 3.10 mm L X 2.60 mm W X 0.90 mm H body)
pins: 1, 2